# Altium footprint library Elettronica FM.PcbLib: 387 footprints (part 3 of 25)
Each footprint in its own frame and in the unit in brackets; x right, y up, seen from the top. Pads: shape width x height; smd on the part's side, far side on the other; paste and mask are expansions set on the pad; w line width, h text height; cw(c..) or ccw(c..) is an arc to the next point about the centre after c.
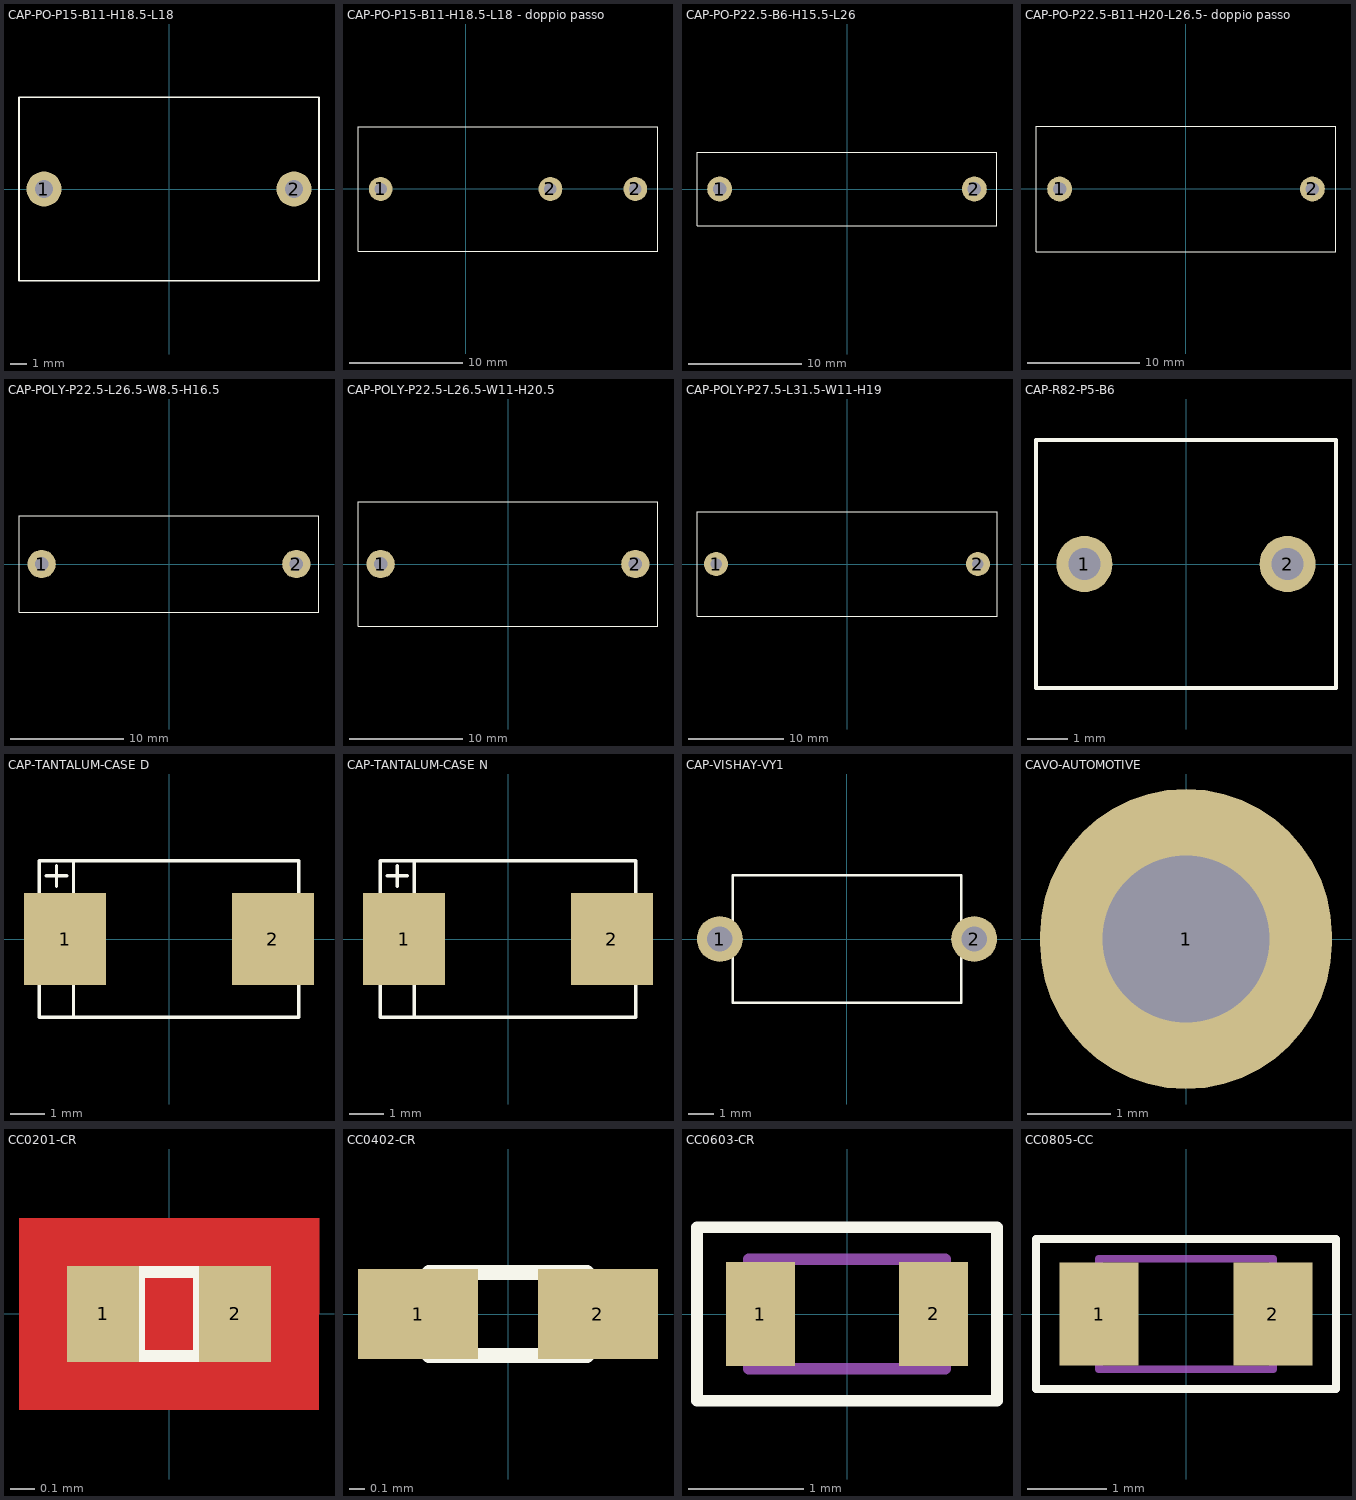
[diagram p2: the footprints below, top view; thin cyan lines are the x and y axes]

## CAP-PO-P15-B11-H18.5-L18 [mm]
height 8.5
pads (2):
  round 2.1 hole 1.1: 1(-7.5,0) 2(7.5,0)
Top Overlay:
  lines w0.1: -9,-5.5 -9,5.5 9,5.5 9,-5.5 -9,-5.5
3D body: height 18.5, standoff 0, extent -9,-5.5 9,5.5

## CAP-PO-P15-B11-H18.5-L18 - doppio passo [mm]
height 8.5
pads (3):
  round 2.1 hole 1.1: 1(-7.5,0) 2(7.5,0) 2(15,0)
Top Overlay:
  lines w0.1: -9.5,-5.5 -9.5,5.5 17,5.5 17,-5.5 -9.5,-5.5
3D body: height 20.5, standoff 0, extent -9.5,-5.5 17,5.5

## CAP-PO-P22.5-B6-H15.5-L26 [mm]
height 8.5
pads (2):
  round 2.2 hole 1.2: 1(-11.25,0) 2(11.25,0)
Top Overlay:
  lines w0.1: -13.25,-3.25 -13.25,3.25 13.25,3.25 13.25,-3.25 -13.25,-3.25
3D body: height 15.6, standoff 0, extent -13.25,-3.25 13.25,3.25

## CAP-PO-P22.5-B11-H20-L26.5- doppio passo [mm]
height 8.5
pads (2):
  round 2.2 hole 1.2: 1(-11.25,0) 2(11.25,0)
Top Overlay:
  lines w0.1: -13.35,-5.6 13.35,-5.6 13.35,5.6 -13.35,5.6 -13.35,-5.6
3D body: height 20.1, standoff 0, extent -13.35,-5.6 13.35,5.6

## CAP-POLY-P22.5-L26.5-W8.5-H16.5 [mm]
pads (2):
  round 2.5 hole 1.2: 1(-11.25,0) 2(11.25,0)
Top Overlay:
  lines w0.1: -13.25,-4.25 13.25,-4.25 13.25,4.25 -13.25,4.25 -13.25,-4.25
3D body: height 16.5, standoff 0, extent -13.25,-4.25 13.25,4.25

## CAP-POLY-P22.5-L26.5-W11-H20.5 [mm]
pads (2):
  round 2.5 hole 1.2: 1(-11.25,0) 2(11.25,0)
Top Overlay:
  lines w0.1: -13.25,-5.5 -13.25,5.5 13.25,5.5 13.25,-5.5 -13.25,-5.5
3D body: height 20.5, standoff 0, extent -13.25,-5.5 13.25,5.5

## CAP-POLY-P27.5-L31.5-W11-H19 [mm]
pads (2):
  round 2.5 hole 1.2: 1(-13.75,0) 2(13.75,0)
Top Overlay:
  lines w0.1: -15.75,-5.5 15.75,-5.5 15.75,5.5 -15.75,5.5 -15.75,-5.5
3D body: height 19, standoff 0, extent -15.75,-5.5 15.75,5.5

## CAP-R82-P5-B6 [mm]
height 8.5
pads (2):
  round 1.4 hole 0.8: 1(-2.54,0) 2(2.54,0)
Top Overlay:
  lines w0.1: -3.75,-3.1 -3.75,3.1 3.75,3.1 3.75,-3.1 -3.75,-3.1
3D body: height 11.1, standoff 0.5, extent -3.75,-3.1 3.75,3.1

## CAP-TANTALUM-CASE D [mm]
height 1.7
pads (2):
  rect 2.4x2.7 smd: 1(-3.05,0) 2(3.05,0)
Top Overlay:
  lines w0.1: -3.8,-1.25 -3.6,-1.25 ; -3.8,1.25 -3.6,1.25 ; -3.6,1.85 -3,1.85 ; -3.4,-1.25 -3.2,-1.25 ; -3.4,1.25 -3.2,1.25 ; -3.3,1.55 -3.3,2.15 ; -3,-1.25 -2.8,-1.25 ; -3,1.25 -2.8,1.25 ; -2.8,-2.3 -2.8,2.3 ; -2.6,-1.25 -2.4,-1.25 ; -2.6,1.25 -2.4,1.25 ; -2.2,-1.25 -2.1,-1.25 -2.1,-1.05 ; -2.2,1.25 -2.1,1.25 -2.1,1.15 ; -2.1,-0.85 -2.1,-0.65 ; -2.1,-0.45 -2.1,-0.25 ; -2.1,-0.05 -2.1,0.15 ; -2.1,0.35 -2.1,0.55 ; -2.1,0.75 -2.1,0.95 ; 2.1,-1.05 2.1,-1.25 2.2,-1.25 ; 2.1,-0.85 2.1,-0.65 ; 2.1,-0.45 2.1,-0.25 ; 2.1,-0.05 2.1,0.15 ; 2.1,0.35 2.1,0.55 ; 2.1,0.75 2.1,0.95 ; 2.1,1.15 2.1,1.25 2.2,1.25 ; 2.4,-1.25 2.6,-1.25 ; 2.4,1.25 2.6,1.25 ; 2.8,-1.25 3,-1.25 ; 2.8,1.25 3,1.25 ; 3.2,-1.25 3.4,-1.25 ; 3.2,1.25 3.4,1.25 ; 3.6,-1.25 3.8,-1.25 ; 3.6,1.25 3.8,1.25 ; -3.8,-2.3 -3.8,2.3 3.8,2.3 3.8,-2.3 -3.8,-2.3
3D body: height 4.3, standoff 0, extent -3.8,-2.3 3.8,2.3

## CAP-TANTALUM-CASE N [mm]
height 1.7
pads (2):
  rect 2.4x2.7 smd: 1(-3.05,0) 2(3.05,0)
Top Overlay:
  lines w0.1: -3.75,-1.25 -3.55,-1.25 ; -3.75,1.25 -3.55,1.25 ; -3.55,1.85 -2.95,1.85 ; -3.35,-1.25 -3.15,-1.25 ; -3.35,1.25 -3.15,1.25 ; -3.25,1.55 -3.25,2.15 ; -2.95,-1.25 -2.75,-1.25 ; -2.95,1.25 -2.75,1.25 ; -2.75,-2.3 -2.75,2.3 ; -2.55,-1.25 -2.35,-1.25 ; -2.55,1.25 -2.35,1.25 ; -2.15,-1.25 -2.05,-1.25 -2.05,-1.05 ; -2.15,1.25 -2.05,1.25 -2.05,1.15 ; -2.05,-0.85 -2.05,-0.65 ; -2.05,-0.45 -2.05,-0.25 ; -2.05,-0.05 -2.05,0.15 ; -2.05,0.35 -2.05,0.55 ; -2.05,0.75 -2.05,0.95 ; 2.05,-1.05 2.05,-1.25 2.15,-1.25 ; 2.05,-0.85 2.05,-0.65 ; 2.05,-0.45 2.05,-0.25 ; 2.05,-0.05 2.05,0.15 ; 2.05,0.35 2.05,0.55 ; 2.05,0.75 2.05,0.95 ; 2.05,1.15 2.05,1.25 2.15,1.25 ; 2.35,-1.25 2.55,-1.25 ; 2.35,1.25 2.55,1.25 ; 2.75,-1.25 2.95,-1.25 ; 2.75,1.25 2.95,1.25 ; 3.15,-1.25 3.35,-1.25 ; 3.15,1.25 3.35,1.25 ; 3.55,-1.25 3.75,-1.25 ; 3.55,1.25 3.75,1.25 ; -3.75,-2.3 3.75,-2.3 3.75,2.3 -3.75,2.3 -3.75,-2.3
3D body: height 4.3, standoff 0, extent -3.75,-2.3 3.75,2.3

## CAP-VISHAY-VY1 [mm]
height 1.9
pads (2):
  round 1.8 hole 1: 1(-5,0) 2(5,0)
Top Overlay:
  lines w0.1: -4.5,-2.5 -4.5,2.5 4.5,2.5 4.5,-2.5 -4.5,-2.5
3D body: height 13, standoff 4, extent -4.5,-2.5 4.5,2.5

## CAVO-AUTOMOTIVE [mm]
pads (1):
  oval 3.5x3.6 hole 2: 1(0,0)
Top Overlay:
  circle w0.1: c0,0 r1.5

## CC0201-CR [mm]
pads (2):
  rect 0.3x0.4 smd paste-2 mask+0.05: 1(-0.275,0) 2(0.275,0)
Top Layer:
  pour cut-out: -0.625,0.4 -0.625,-0.4 0.625,-0.4 0.625,0.4
Top Overlay:
  lines w0.05: -0.125,-0.175 -0.125,0.175 ; 0.125,-0.175 0.125,0.175 ; -0.325,-0.175 -0.325,0.175 0.325,0.175 0.325,-0.175 -0.325,-0.175
Top Paste:
  region: 0.425,0.2 0.425,-0.2 0.15,-0.2 0.15,0.2
  region: -0.425,0.2 -0.425,-0.2 -0.15,-0.2 -0.15,0.2
Top Solder:
  region: -0.525,0.3 -0.525,-0.3 0.525,-0.3 0.525,0.3
3D body: height 0.3, standoff 0, extent -0.313,-0.175 0.337,0.175

## CC0402-CR [mm]
pads (2):
  rect 0.8x0.6 smd paste-0.05: 1(-0.6,0) 2(0.6,0)
Top Overlay:
  lines w0.1: -0.525,-0.275 0.525,-0.275 0.525,0.275 -0.525,0.275 -0.525,-0.275
3D body: height 0.6, standoff 0, extent -0.525,-0.275 0.525,0.275

## CC0603-CR [mm]
height 1.9
pads (2):
  rect 0.6x0.9 smd: 1(-0.75,0) 2(0.75,0)
Top Overlay:
  lines w0.1: -1.3,-0.75 -1.3,0.75 1.3,0.75 1.3,-0.75 -1.3,-0.75
Mechanical 3:
  lines w0.1: -0.85,-0.475 -0.85,0.475 0.85,0.475 0.85,-0.475 -0.85,-0.475
3D body: height 0.95, standoff 0, extent -0.85,-0.475 0.85,0.475

## CC0805-CC [mm]
height 1.9
pads (2):
  rect 1x1.3 smd paste-5: 1(-1.1,0) 2(1.1,0)
Top Overlay:
  lines w0.1: -1.9,-0.95 -1.9,0.95 1.9,0.95 1.9,-0.95 -1.9,-0.95
Top Paste:
  region: -1.55,0.6 -1.1,0.6 -0.95,0.6 -0.65,0 -0.95,-0.6 -1.55,-0.6
  region: 1.55,0.6 1.1,0.6 0.95,0.6 0.65,0 0.95,-0.6 1.55,-0.6
Mechanical 3:
  lines w0.1: -1.1,-0.7 -1.1,0.7 1.1,0.7 1.1,-0.7 -1.1,-0.7
3D body "res0805.STEP": height 0.5, standoff 0, extent -1,-0.625 1,0.625